# Altium integrated library WR-FPC_rev19a.IntLib: 242 symbols (part 1 of 2) (continued)
## 686106148922 (continued)
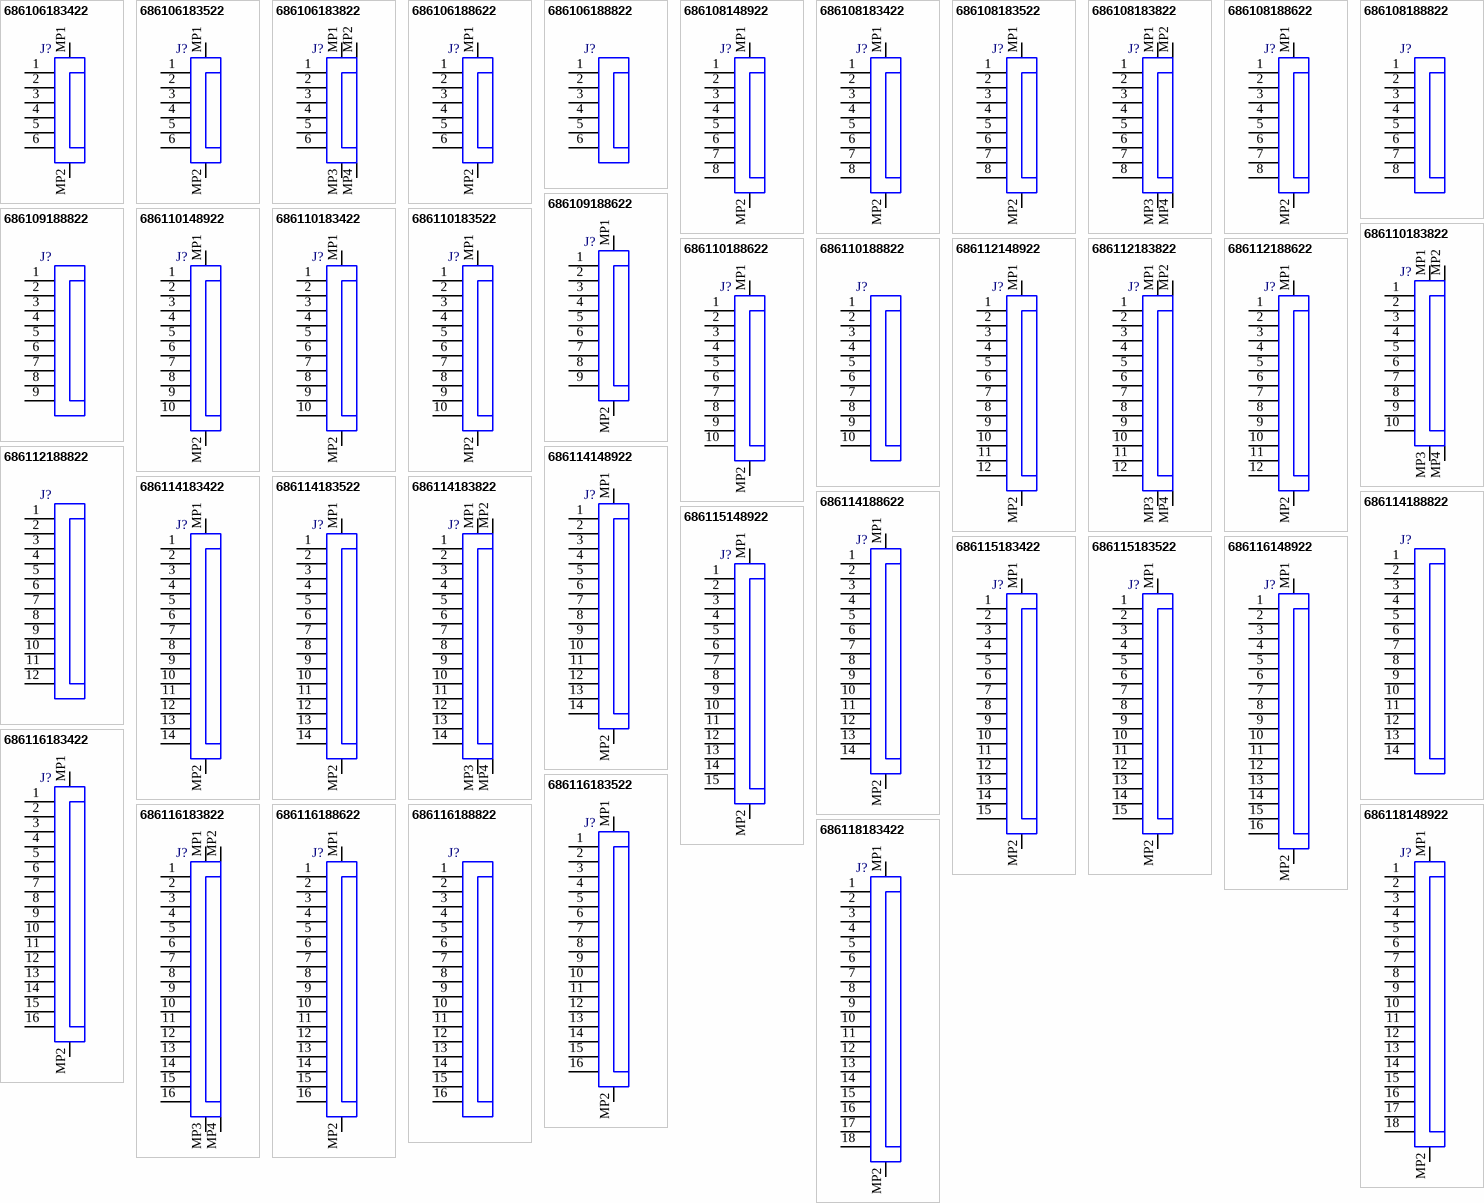
[diagram p1: symbols 686106183422 to 686118183422]

## 686106183422
designator J?
WR-FPC SMT ZIF Horizontal Top Contact Low Profile, pitch 1mm, 6p; Part Number: 686106183422; Contact Resistance: 30mOhm; Pin Number: 6; Working Voltage: 50VAC; Rated Current: 0.8A; ComponentLink1Description: Manufacturer; ComponentLink1URL: http://www.we-online.de; ComponentLink2Description: Datasheet; ComponentLink2URL: https://katalog.we-online.com/em/datasheet/686106183422.pdf; Packaging: Tape and Reel; Pitch: 1mm; Published Date: November 2019; Mounting Technology: SMT; Operating Temperature: -25 to +85degC; Length: 12.2mm; Type: Horizontal; Publisher: Wurth Elektronik
footprint 686106183422
pins: 1, 2, 3, 4, 5, 6, MP1, MP2

## 686106183522
designator J?
WR-FPC SMT ZIF Horizontal Bottom Contact Low Profile, pitch 1mm, 6p; Part Number: 686106183522; Contact Resistance: 30mOhm; Pin Number: 6; Working Voltage: 50VAC; Rated Current: 0.8A; ComponentLink1Description: Manufacturer; ComponentLink1URL: http://www.we-online.de; ComponentLink2Description: Datasheet; ComponentLink2URL: https://katalog.we-online.com/em/datasheet/686106183522.pdf; Packaging: Tape and Reel; Pitch: 1mm; Published Date: November 2019; Mounting Technology: SMT; Operating Temperature: -25 to +85degC; Length: 12.2mm; Type: Horizontal; Publisher: Wurth Elektronik
footprint 686106183522
pins: 1, 2, 3, 4, 5, 6, MP1, MP2

## 686106183822
designator J?
WR-FPC SMT ZIF Vertical Type A, pitch 1mm, 6p; Part Number: 686106183822; Contact Resistance: 30mOhm; Pin Number: 6; Working Voltage: 125VAC; Rated Current: 1A; ComponentLink1Description: Manufacturer; ComponentLink1URL: http://www.we-online.de; ComponentLink2Description: Datasheet; ComponentLink2URL: https://katalog.we-online.com/em/datasheet/686106183822.pdf; Packaging: Tape and Reel; Pitch: 1mm; Published Date: November 2019; Mounting Technology: SMT; Operating Temperature: -25 to +85degC; Length: 12.8mm; Type: Vertical; Publisher: Wurth Elektronik
footprint 686106183822
pins: 1, 2, 3, 4, 5, 6, MP1, MP2, MP3, MP4

## 686106188622
designator J?
WR-FPC SMT LIF Horizontal Top Contact, pitch 1mm, 6p; Part Number: 686106188622; Contact Resistance: 30mOhm; Pin Number: 6; Working Voltage: 125VAC; Rated Current: 1A; ComponentLink1Description: Manufacturer; ComponentLink1URL: http://www.we-online.de; ComponentLink2Description: Datasheet; ComponentLink2URL: https://katalog.we-online.com/em/datasheet/686106188622.pdf; Packaging: Tape and Reel; Pitch: 1mm; Published Date: November 2019; Mounting Technology: SMT; Operating Temperature: -25 to +85degC; Length: 9.8mm; Type: Horizontal; Publisher: Wurth Elektronik
footprint 686106188622
pins: 1, 2, 3, 4, 5, 6, MP1, MP2

## 686106188822
designator J?
WR-FPC SMT LIF Vertical Type A, pitch 1mm, 6p; Part Number: 686106188822; Contact Resistance: 30mOhm; Pin Number: 6; Working Voltage: 125VAC; Rated Current: 1A; ComponentLink1Description: Manufacturer; ComponentLink1URL: http://www.we-online.de; ComponentLink2Description: Datasheet; ComponentLink2URL: https://katalog.we-online.com/em/datasheet/686106188822.pdf; Packaging: Tape and Reel; Pitch: 1mm; Published Date: November 2019; Mounting Technology: SMT; Operating Temperature: -25 to +85degC; Length: 9mm; Type: Vertical; Publisher: Wurth Elektronik
footprint 686106188822
pins: 1, 2, 3, 4, 5, 6

## 686108148922
designator J?
WR-FPC SMT ZIF Horizontal Bottom Contact Hinge Type, pitch 1mm, 8p; Part Number: 686108148922; Contact Resistance: 50mOhm; Pin Number: 8; Working Voltage: 100VAC; Rated Current: 1A; ComponentLink1Description: Manufacturer; ComponentLink1URL: http://www.we-online.de; ComponentLink2Description: Datasheet; ComponentLink2URL: https://katalog.we-online.com/em/datasheet/686108148922.pdf; Packaging: Tape and Reel; Pitch: 1mm; Published Date: November 2019; Mounting Technology: SMT; Operating Temperature: -25 to +85degC; Length: 12.6mm; Type: Horizontal; Publisher: Wurth Elektronik
footprint 686108148922
pins: 1, 2, 3, 4, 5, 6, 7, 8, MP1, MP2

## 686108183422
designator J?
WR-FPC SMT ZIF Horizontal Top Contact Low Profile, pitch 1mm, 8p; Part Number: 686108183422; Contact Resistance: 30mOhm; Pin Number: 8; Working Voltage: 50VAC; Rated Current: 0.8A; ComponentLink1Description: Manufacturer; ComponentLink1URL: http://www.we-online.de; ComponentLink2Description: Datasheet; ComponentLink2URL: https://katalog.we-online.com/em/datasheet/686108183422.pdf; Packaging: Tape and Reel; Pitch: 1mm; Published Date: November 2019; Mounting Technology: SMT; Operating Temperature: -25 to +85degC; Length: 14.2mm; Type: Horizontal; Publisher: Wurth Elektronik
footprint 686108183422
pins: 1, 2, 3, 4, 5, 6, 7, 8, MP1, MP2

## 686108183522
designator J?
WR-FPC SMT ZIF Horizontal Bottom Contact Low Profile, pitch 1mm, 8p; Part Number: 686108183522; Contact Resistance: 30mOhm; Pin Number: 8; Working Voltage: 50VAC; Rated Current: 0.8A; ComponentLink1Description: Manufacturer; ComponentLink1URL: http://www.we-online.de; ComponentLink2Description: Datasheet; ComponentLink2URL: https://katalog.we-online.com/em/datasheet/686108183522.pdf; Packaging: Tape and Reel; Pitch: 1mm; Published Date: November 2019; Mounting Technology: SMT; Operating Temperature: -25 to +85degC; Length: 14.2mm; Type: Horizontal; Publisher: Wurth Elektronik
footprint 686108183522
pins: 1, 2, 3, 4, 5, 6, 7, 8, MP1, MP2

## 686108183822
designator J?
WR-FPC SMT ZIF Vertical Type A, pitch 1mm, 8p; Part Number: 686108183822; Contact Resistance: 30mOhm; Pin Number: 8; Working Voltage: 125VAC; Rated Current: 1A; ComponentLink1Description: Manufacturer; ComponentLink1URL: http://www.we-online.de; ComponentLink2Description: Datasheet; ComponentLink2URL: https://katalog.we-online.com/em/datasheet/686108183822.pdf; Packaging: Tape and Reel; Pitch: 1mm; Published Date: November 2019; Mounting Technology: SMT; Operating Temperature: -25 to +85degC; Length: 14.8mm; Type: Vertical; Publisher: Wurth Elektronik
footprint 686108183822
pins: 1, 2, 3, 4, 5, 6, 7, 8, MP1, MP2, MP3, MP4

## 686108188622
designator J?
WR-FPC SMT LIF Horizontal Top Contact, pitch 1mm, 8p; Part Number: 686108188622; Contact Resistance: 30mOhm; Pin Number: 8; Working Voltage: 125VAC; Rated Current: 1A; ComponentLink1Description: Manufacturer; ComponentLink1URL: http://www.we-online.de; ComponentLink2Description: Datasheet; ComponentLink2URL: https://katalog.we-online.com/em/datasheet/686108188622.pdf; Packaging: Tape and Reel; Pitch: 1mm; Published Date: November 2019; Mounting Technology: SMT; Operating Temperature: -25 to +85degC; Length: 11.8mm; Type: Horizontal; Publisher: Wurth Elektronik
footprint 686108188622
pins: 1, 2, 3, 4, 5, 6, 7, 8, MP1, MP2

## 686108188822
designator J?
WR-FPC SMT LIF Vertical Type A, pitch 1mm, 8p; Part Number: 686108188822; Contact Resistance: 30mOhm; Pin Number: 8; Working Voltage: 125VAC; Rated Current: 1A; ComponentLink1Description: Manufacturer; ComponentLink1URL: http://www.we-online.de; ComponentLink2Description: Datasheet; ComponentLink2URL: https://katalog.we-online.com/em/datasheet/686108188822.pdf; Packaging: Tape and Reel; Pitch: 1mm; Published Date: November 2019; Mounting Technology: SMT; Operating Temperature: -25 to +85degC; Length: 11mm; Type: Vertical; Publisher: Wurth Elektronik
footprint 686108188822
pins: 1, 2, 3, 4, 5, 6, 7, 8

## 686109188622
designator J?
WR-FPC SMT LIF Horizontal Top Contact, pitch 1mm, 9p; Part Number: 686109188622; Contact Resistance: 30mOhm; Pin Number: 9; Working Voltage: 125VAC; Rated Current: 1A; ComponentLink1Description: Manufacturer; ComponentLink1URL: http://www.we-online.de; ComponentLink2Description: Datasheet; ComponentLink2URL: https://katalog.we-online.com/em/datasheet/686109188622.pdf; Packaging: Tape and Reel; Pitch: 1mm; Published Date: November 2019; Mounting Technology: SMT; Operating Temperature: -25 to +85degC; Length: 12.8mm; Type: Horizontal; Publisher: Wurth Elektronik
footprint 686109188622
pins: 1, 2, 3, 4, 5, 6, 7, 8, 9, MP1, MP2

## 686109188822
designator J?
WR-FPC SMT LIF Vertical Type A, pitch 1mm, 9p; Part Number: 686109188822; Contact Resistance: 30mOhm; Pin Number: 9; Working Voltage: 125VAC; Rated Current: 1A; ComponentLink1Description: Manufacturer; ComponentLink1URL: http://www.we-online.de; ComponentLink2Description: Datasheet; ComponentLink2URL: https://katalog.we-online.com/em/datasheet/686109188822.pdf; Packaging: Tape and Reel; Pitch: 1mm; Published Date: November 2019; Mounting Technology: SMT; Operating Temperature: -25 to +85degC; Length: 12mm; Type: Vertical; Publisher: Wurth Elektronik
footprint 686109188822
pins: 1, 2, 3, 4, 5, 6, 7, 8, 9

## 686110148922
designator J?
WR-FPC SMT ZIF Horizontal Bottom Contact Hinge Type, pitch 1mm, 10p; Part Number: 686110148922; Contact Resistance: 50mOhm; Pin Number: 10; Working Voltage: 100VAC; Rated Current: 1A; ComponentLink1Description: Manufacturer; ComponentLink1URL: http://www.we-online.de; ComponentLink2Description: Datasheet; ComponentLink2URL: https://katalog.we-online.com/em/datasheet/686110148922.pdf; Packaging: Tape and Reel; Pitch: 1mm; Published Date: November 2019; Mounting Technology: SMT; Operating Temperature: -25 to +85degC; Length: 14.6mm; Type: Horizontal; Publisher: Wurth Elektronik
footprint 686110148922
pins: 1, 2, 3, 4, 5, 6, 7, 8, 9, 10, MP1, MP2

## 686110183422
designator J?
WR-FPC SMT ZIF Horizontal Top Contact Low Profile, pitch 1mm, 10p; Part Number: 686110183422; Contact Resistance: 30mOhm; Pin Number: 10; Working Voltage: 50VAC; Rated Current: 0.8A; ComponentLink1Description: Manufacturer; ComponentLink1URL: http://www.we-online.de; ComponentLink2Description: Datasheet; ComponentLink2URL: https://katalog.we-online.com/em/datasheet/686110183422.pdf; Packaging: Tape and Reel; Pitch: 1mm; Published Date: November 2019; Mounting Technology: SMT; Operating Temperature: -25 to +85degC; Length: 16.2mm; Type: Horizontal; Publisher: Wurth Elektronik
footprint 686110183422
pins: 1, 2, 3, 4, 5, 6, 7, 8, 9, 10, MP1, MP2

## 686110183522
designator J?
WR-FPC SMT ZIF Horizontal Bottom Contact Low Profile, pitch 1mm, 10p; Part Number: 686110183522; Contact Resistance: 30mOhm; Pin Number: 10; Working Voltage: 50VAC; Rated Current: 0.8A; ComponentLink1Description: Manufacturer; ComponentLink1URL: http://www.we-online.de; ComponentLink2Description: Datasheet; ComponentLink2URL: https://katalog.we-online.com/em/datasheet/686110183522.pdf; Packaging: Tape and Reel; Pitch: 1mm; Published Date: November 2019; Mounting Technology: SMT; Operating Temperature: -25 to +85degC; Length: 16.2mm; Type: Horizontal; Publisher: Wurth Elektronik
footprint 686110183522
pins: 1, 2, 3, 4, 5, 6, 7, 8, 9, 10, MP1, MP2

## 686110183822
designator J?
WR-FPC SMT ZIF Vertical Type A, pitch 1mm, 10p; Part Number: 686110183822; Contact Resistance: 30mOhm; Pin Number: 10; Working Voltage: 125VAC; Rated Current: 1A; ComponentLink1Description: Manufacturer; ComponentLink1URL: http://www.we-online.de; ComponentLink2Description: Datasheet; ComponentLink2URL: https://katalog.we-online.com/em/datasheet/686110183822.pdf; Packaging: Tape and Reel; Pitch: 1mm; Published Date: November 2019; Mounting Technology: SMT; Operating Temperature: -25 to +85degC; Length: 16.8mm; Type: Vertical; Publisher: Wurth Elektronik
footprint 686110183822
pins: 1, 2, 3, 4, 5, 6, 7, 8, 9, 10, MP1, MP2, MP3, MP4

## 686110188622
designator J?
WR-FPC SMT LIF Horizontal Top Contact, pitch 1mm, 10p; Part Number: 686110188622; Contact Resistance: 30mOhm; Pin Number: 10; Working Voltage: 125VAC; Rated Current: 1A; ComponentLink1Description: Manufacturer; ComponentLink1URL: http://www.we-online.de; ComponentLink2Description: Datasheet; ComponentLink2URL: https://katalog.we-online.com/em/datasheet/686110188622.pdf; Packaging: Tape and Reel; Pitch: 1mm; Published Date: November 2019; Mounting Technology: SMT; Operating Temperature: -25 to +85degC; Length: 13.8mm; Type: Horizontal; Publisher: Wurth Elektronik
footprint 686110188622
pins: 1, 2, 3, 4, 5, 6, 7, 8, 9, 10, MP1, MP2

## 686110188822
designator J?
WR-FPC SMT LIF Vertical Type A, pitch 1mm, 10p; Part Number: 686110188822; Contact Resistance: 30mOhm; Pin Number: 10; Working Voltage: 125VAC; Rated Current: 1A; ComponentLink1Description: Manufacturer; ComponentLink1URL: http://www.we-online.de; ComponentLink2Description: Datasheet; ComponentLink2URL: https://katalog.we-online.com/em/datasheet/686110188822.pdf; Packaging: Tape and Reel; Pitch: 1mm; Published Date: November 2019; Mounting Technology: SMT; Operating Temperature: -25 to +85degC; Length: 13mm; Type: Vertical; Publisher: Wurth Elektronik
footprint 686110188822
pins: 1, 2, 3, 4, 5, 6, 7, 8, 9, 10

## 686112148922
designator J?
WR-FPC SMT ZIF Horizontal Bottom Contact Hinge Type, pitch 1mm, 12p; Part Number: 686112148922; Contact Resistance: 50mOhm; Pin Number: 12; Working Voltage: 100VAC; Rated Current: 1A; ComponentLink1Description: Manufacturer; ComponentLink1URL: http://www.we-online.de; ComponentLink2Description: Datasheet; ComponentLink2URL: https://katalog.we-online.com/em/datasheet/686112148922.pdf; Packaging: Tape and Reel; Pitch: 1mm; Published Date: November 2019; Mounting Technology: SMT; Operating Temperature: -25 to +85degC; Length: 16.6mm; Type: Horizontal; Publisher: Wurth Elektronik
footprint 686112148922
pins: 1, 2, 3, 4, 5, 6, 7, 8, 9, 10, 11, 12, MP1, MP2

## 686112183822
designator J?
WR-FPC SMT ZIF Vertical Type A, pitch 1mm, 12p; Part Number: 686112183822; Contact Resistance: 30mOhm; Pin Number: 12; Working Voltage: 125VAC; Rated Current: 1A; ComponentLink1Description: Manufacturer; ComponentLink1URL: http://www.we-online.de; ComponentLink2Description: Datasheet; ComponentLink2URL: https://katalog.we-online.com/em/datasheet/686112183822.pdf; Packaging: Tape and Reel; Pitch: 1mm; Published Date: November 2019; Mounting Technology: SMT; Operating Temperature: -25 to +85degC; Length: 18.8mm; Type: Vertical; Publisher: Wurth Elektronik
footprint 686112183822
pins: 1, 2, 3, 4, 5, 6, 7, 8, 9, 10, 11, 12, MP1, MP2, MP3, MP4

## 686112188622
designator J?
WR-FPC SMT LIF Horizontal Top Contact, pitch 1mm, 12p; Part Number: 686112188622; Contact Resistance: 30mOhm; Pin Number: 12; Working Voltage: 125VAC; Rated Current: 1A; ComponentLink1Description: Manufacturer; ComponentLink1URL: http://www.we-online.de; ComponentLink2Description: Datasheet; ComponentLink2URL: https://katalog.we-online.com/em/datasheet/686112188622.pdf; Packaging: Tape and Reel; Pitch: 1mm; Published Date: November 2019; Mounting Technology: SMT; Operating Temperature: -25 to +85degC; Length: 15.8mm; Type: Horizontal; Publisher: Wurth Elektronik
footprint 686112188622
pins: 1, 2, 3, 4, 5, 6, 7, 8, 9, 10, 11, 12, MP1, MP2

## 686112188822
designator J?
WR-FPC SMT LIF Vertical Type A, pitch 1mm, 12p; Part Number: 686112188822; Contact Resistance: 30mOhm; Pin Number: 12; Working Voltage: 125VAC; Rated Current: 1A; ComponentLink1Description: Manufacturer; ComponentLink1URL: http://www.we-online.de; ComponentLink2Description: Datasheet; ComponentLink2URL: https://katalog.we-online.com/em/datasheet/686112188822.pdf; Packaging: Tape and Reel; Pitch: 1mm; Published Date: November 2019; Mounting Technology: SMT; Operating Temperature: -25 to +85degC; Length: 15mm; Type: Vertical; Publisher: Wurth Elektronik
footprint 686112188822
pins: 1, 2, 3, 4, 5, 6, 7, 8, 9, 10, 11, 12

## 686114148922
designator J?
WR-FPC SMT ZIF Horizontal Bottom Contact Hinge Type, pitch 1mm, 14p; Part Number: 686114148922; Contact Resistance: 50mOhm; Pin Number: 14; Working Voltage: 100VAC; Rated Current: 1A; ComponentLink1Description: Manufacturer; ComponentLink1URL: http://www.we-online.de; ComponentLink2Description: Datasheet; ComponentLink2URL: https://katalog.we-online.com/em/datasheet/686114148922.pdf; Packaging: Tape and Reel; Pitch: 1mm; Published Date: November 2019; Mounting Technology: SMT; Operating Temperature: -25 to +85degC; Length: 18.6mm; Type: Horizontal; Publisher: Wurth Elektronik
footprint 686114148922
pins: 1, 2, 3, 4, 5, 6, 7, 8, 9, 10, 11, 12, 13, 14, MP1, MP2

## 686114183422
designator J?
WR-FPC SMT ZIF Horizontal Top Contact Low Profile, pitch 1mm, 14p; Part Number: 686114183422; Contact Resistance: 30mOhm; Pin Number: 14; Working Voltage: 50VAC; Rated Current: 0.8A; ComponentLink1Description: Manufacturer; ComponentLink1URL: http://www.we-online.de; ComponentLink2Description: Datasheet; ComponentLink2URL: https://katalog.we-online.com/em/datasheet/686114183422.pdf; Packaging: Tape and Reel; Pitch: 1mm; Published Date: November 2019; Mounting Technology: SMT; Operating Temperature: -25 to +85degC; Length: 20.2mm; Type: Horizontal; Publisher: Wurth Elektronik
footprint 686114183422
pins: 1, 2, 3, 4, 5, 6, 7, 8, 9, 10, 11, 12, 13, 14, MP1, MP2

## 686114183522
designator J?
WR-FPC SMT ZIF Horizontal Bottom Contact Low Profile, pitch 1mm, 14p; Part Number: 686114183522; Contact Resistance: 30mOhm; Pin Number: 14; Working Voltage: 50VAC; Rated Current: 0.8A; ComponentLink1Description: Manufacturer; ComponentLink1URL: http://www.we-online.de; ComponentLink2Description: Datasheet; ComponentLink2URL: https://katalog.we-online.com/em/datasheet/686114183522.pdf; Packaging: Tape and Reel; Pitch: 1mm; Published Date: November 2019; Mounting Technology: SMT; Operating Temperature: -25 to +85degC; Length: 20.2mm; Type: Horizontal; Publisher: Wurth Elektronik
footprint 686114183522
pins: 1, 2, 3, 4, 5, 6, 7, 8, 9, 10, 11, 12, 13, 14, MP1, MP2

## 686114183822
designator J?
WR-FPC SMT ZIF Vertical Type A, pitch 1mm, 14p; Part Number: 686114183822; Contact Resistance: 30mOhm; Pin Number: 14; Working Voltage: 125VAC; Rated Current: 1A; ComponentLink1Description: Manufacturer; ComponentLink1URL: http://www.we-online.de; ComponentLink2Description: Datasheet; ComponentLink2URL: https://katalog.we-online.com/em/datasheet/686114183822.pdf; Packaging: Tape and Reel; Pitch: 1mm; Published Date: November 2019; Mounting Technology: SMT; Operating Temperature: -25 to +85degC; Length: 20.8mm; Type: Vertical; Publisher: Wurth Elektronik
footprint 686114183822
pins: 1, 2, 3, 4, 5, 6, 7, 8, 9, 10, 11, 12, 13, 14, MP1, MP2, MP3, MP4

## 686114188622
designator J?
WR-FPC SMT LIF Horizontal Top Contact, pitch 1mm, 14p; Part Number: 686114188622; Contact Resistance: 30mOhm; Pin Number: 14; Working Voltage: 125VAC; Rated Current: 1A; ComponentLink1Description: Manufacturer; ComponentLink1URL: http://www.we-online.de; ComponentLink2Description: Datasheet; ComponentLink2URL: https://katalog.we-online.com/em/datasheet/686114188622.pdf; Packaging: Tape and Reel; Pitch: 1mm; Published Date: November 2019; Mounting Technology: SMT; Operating Temperature: -25 to +85degC; Length: 17.8mm; Type: Horizontal; Publisher: Wurth Elektronik
footprint 686114188622
pins: 1, 2, 3, 4, 5, 6, 7, 8, 9, 10, 11, 12, 13, 14, MP1, MP2

## 686114188822
designator J?
WR-FPC SMT LIF Vertical Type A, pitch 1mm, 14p; Part Number: 686114188822; Contact Resistance: 30mOhm; Pin Number: 14; Working Voltage: 125VAC; Rated Current: 1A; ComponentLink1Description: Manufacturer; ComponentLink1URL: http://www.we-online.de; ComponentLink2Description: Datasheet; ComponentLink2URL: https://katalog.we-online.com/em/datasheet/686114188822.pdf; Packaging: Tape and Reel; Pitch: 1mm; Published Date: November 2019; Mounting Technology: SMT; Operating Temperature: -25 to +85degC; Length: 17mm; Type: Vertical; Publisher: Wurth Elektronik
footprint 686114188822
pins: 1, 2, 3, 4, 5, 6, 7, 8, 9, 10, 11, 12, 13, 14

## 686115148922
designator J?
WR-FPC SMT ZIF Horizontal Bottom Contact Hinge Type, pitch 1mm, 15p; Part Number: 686115148922; Contact Resistance: 50mOhm; Pin Number: 15; Working Voltage: 100VAC; Rated Current: 1A; ComponentLink1Description: Manufacturer; ComponentLink1URL: http://www.we-online.de; ComponentLink2Description: Datasheet; ComponentLink2URL: https://katalog.we-online.com/em/datasheet/686115148922.pdf; Packaging: Tape and Reel; Pitch: 1mm; Published Date: November 2019; Mounting Technology: SMT; Operating Temperature: -25 to +85degC; Length: 19.6mm; Type: Horizontal; Publisher: Wurth Elektronik
footprint 686115148922
pins: 1, 2, 3, 4, 5, 6, 7, 8, 9, 10, 11, 12, 13, 14, 15, MP1, MP2

## 686115183422
designator J?
WR-FPC SMT ZIF Horizontal Top Contact Low Profile, pitch 1mm, 15p; Part Number: 686115183422; Contact Resistance: 30mOhm; Pin Number: 15; Working Voltage: 50VAC; Rated Current: 0.8A; ComponentLink1Description: Manufacturer; ComponentLink1URL: http://www.we-online.de; ComponentLink2Description: Datasheet; ComponentLink2URL: https://katalog.we-online.com/em/datasheet/686115183422.pdf; Packaging: Tape and Reel; Pitch: 1mm; Published Date: November 2019; Mounting Technology: SMT; Operating Temperature: -25 to +85degC; Length: 21.2mm; Type: Horizontal; Publisher: Wurth Elektronik
footprint 686115183422
pins: 1, 2, 3, 4, 5, 6, 7, 8, 9, 10, 11, 12, 13, 14, 15, MP1, MP2

## 686115183522
designator J?
WR-FPC SMT ZIF Horizontal Bottom Contact Low Profile, pitch 1mm, 15p; Part Number: 686115183522; Contact Resistance: 30mOhm; Pin Number: 15; Working Voltage: 50VAC; Rated Current: 0.8A; ComponentLink1Description: Manufacturer; ComponentLink1URL: http://www.we-online.de; ComponentLink2Description: Datasheet; ComponentLink2URL: https://katalog.we-online.com/em/datasheet/686115183522.pdf; Packaging: Tape and Reel; Pitch: 1mm; Published Date: November 2019; Mounting Technology: SMT; Operating Temperature: -25 to +85degC; Length: 21.2mm; Type: Horizontal; Publisher: Wurth Elektronik
footprint 686115183522
pins: 1, 2, 3, 4, 5, 6, 7, 8, 9, 10, 11, 12, 13, 14, 15, MP1, MP2

## 686116148922
designator J?
WR-FPC SMT ZIF Horizontal Bottom Contact Hinge Type, pitch 1mm, 16p; Part Number: 686116148922; Contact Resistance: 50mOhm; Pin Number: 16; Working Voltage: 100VAC; Rated Current: 1A; ComponentLink1Description: Manufacturer; ComponentLink1URL: http://www.we-online.de; ComponentLink2Description: Datasheet; ComponentLink2URL: https://katalog.we-online.com/em/datasheet/686116148922.pdf; Packaging: Tape and Reel; Pitch: 1mm; Published Date: November 2019; Mounting Technology: SMT; Operating Temperature: -25 to +85degC; Length: 20.6mm; Type: Horizontal; Publisher: Wurth Elektronik
footprint 686116148922
pins: 1, 2, 3, 4, 5, 6, 7, 8, 9, 10, 11, 12, 13, 14, 15, 16, MP1, MP2

## 686116183422
designator J?
WR-FPC SMT ZIF Horizontal Top Contact Low Profile, pitch 1mm, 16p; Part Number: 686116183422; Contact Resistance: 30mOhm; Pin Number: 16; Working Voltage: 50VAC; Rated Current: 0.8A; ComponentLink1Description: Manufacturer; ComponentLink1URL: http://www.we-online.de; ComponentLink2Description: Datasheet; ComponentLink2URL: https://katalog.we-online.com/em/datasheet/686116183422.pdf; Packaging: Tape and Reel; Pitch: 1mm; Published Date: November 2019; Mounting Technology: SMT; Operating Temperature: -25 to +85degC; Length: 22.2mm; Type: Horizontal; Publisher: Wurth Elektronik
footprint 686116183422
pins: 1, 2, 3, 4, 5, 6, 7, 8, 9, 10, 11, 12, 13, 14, 15, 16, MP1, MP2

## 686116183522
designator J?
WR-FPC SMT ZIF Horizontal Bottom Contact Low Profile, pitch 1mm, 16p; Part Number: 686116183522; Contact Resistance: 30mOhm; Pin Number: 16; Working Voltage: 50VAC; Rated Current: 0.8A; ComponentLink1Description: Manufacturer; ComponentLink1URL: http://www.we-online.de; ComponentLink2Description: Datasheet; ComponentLink2URL: https://katalog.we-online.com/em/datasheet/686116183522.pdf; Packaging: Tape and Reel; Pitch: 1mm; Published Date: November 2019; Mounting Technology: SMT; Operating Temperature: -25 to +85degC; Length: 22.2mm; Type: Horizontal; Publisher: Wurth Elektronik
footprint 686116183522
pins: 1, 2, 3, 4, 5, 6, 7, 8, 9, 10, 11, 12, 13, 14, 15, 16, MP1, MP2

## 686116183822
designator J?
WR-FPC SMT ZIF Vertical Type A, pitch 1mm, 16p; Part Number: 686116183822; Contact Resistance: 30mOhm; Pin Number: 16; Working Voltage: 125VAC; Rated Current: 1A; ComponentLink1Description: Manufacturer; ComponentLink1URL: http://www.we-online.de; ComponentLink2Description: Datasheet; ComponentLink2URL: https://katalog.we-online.com/em/datasheet/686116183822.pdf; Packaging: Tape and Reel; Pitch: 1mm; Published Date: November 2019; Mounting Technology: SMT; Operating Temperature: -25 to +85degC; Length: 22.8mm; Type: Vertical; Publisher: Wurth Elektronik
footprint 686116183822
pins: 1, 2, 3, 4, 5, 6, 7, 8, 9, 10, 11, 12, 13, 14, 15, 16, MP1, MP2, MP3, MP4

## 686116188622
designator J?
WR-FPC SMT LIF Horizontal Top Contact, pitch 1mm, 16p; Part Number: 686116188622; Contact Resistance: 30mOhm; Pin Number: 16; Working Voltage: 125VAC; Rated Current: 1A; ComponentLink1Description: Manufacturer; ComponentLink1URL: http://www.we-online.de; ComponentLink2Description: Datasheet; ComponentLink2URL: https://katalog.we-online.com/em/datasheet/686116188622.pdf; Packaging: Tape and Reel; Pitch: 1mm; Published Date: November 2019; Mounting Technology: SMT; Operating Temperature: -25 to +85degC; Length: 19.8mm; Type: Horizontal; Publisher: Wurth Elektronik
footprint 686116188622
pins: 1, 2, 3, 4, 5, 6, 7, 8, 9, 10, 11, 12, 13, 14, 15, 16, MP1, MP2

## 686116188822
designator J?
WR-FPC SMT LIF Vertical Type A, pitch 1mm, 16p; Part Number: 686116188822; Contact Resistance: 30mOhm; Pin Number: 16; Working Voltage: 125VAC; Rated Current: 1A; ComponentLink1Description: Manufacturer; ComponentLink1URL: http://www.we-online.de; ComponentLink2Description: Datasheet; ComponentLink2URL: https://katalog.we-online.com/em/datasheet/686116188822.pdf; Packaging: Tape and Reel; Pitch: 1mm; Published Date: November 2019; Mounting Technology: SMT; Operating Temperature: -25 to +85degC; Length: 19mm; Type: Vertical; Publisher: Wurth Elektronik
footprint 686116188822
pins: 1, 2, 3, 4, 5, 6, 7, 8, 9, 10, 11, 12, 13, 14, 15, 16

## 686118148922
designator J?
WR-FPC SMT ZIF Horizontal Bottom Contact Hinge Type, pitch 1mm, 18p; Part Number: 686118148922; Contact Resistance: 50mOhm; Pin Number: 18; Working Voltage: 100VAC; Rated Current: 1A; ComponentLink1Description: Manufacturer; ComponentLink1URL: http://www.we-online.de; ComponentLink2Description: Datasheet; ComponentLink2URL: https://katalog.we-online.com/em/datasheet/686118148922.pdf; Packaging: Tape and Reel; Pitch: 1mm; Published Date: November 2019; Mounting Technology: SMT; Operating Temperature: -25 to +85degC; Length: 22.6mm; Type: Horizontal; Publisher: Wurth Elektronik
footprint 686118148922
pins: 1, 2, 3, 4, 5, 6, 7, 8, 9, 10, 11, 12, 13, 14, 15, 16, 17, 18, MP1, MP2

## 686118183422
designator J?
WR-FPC SMT ZIF Horizontal Top Contact Low Profile, pitch 1mm, 18p; Part Number: 686118183422; Contact Resistance: 30mOhm; Pin Number: 18; Working Voltage: 50VAC; Rated Current: 0.8A; ComponentLink1Description: Manufacturer; ComponentLink1URL: http://www.we-online.de; ComponentLink2Description: Datasheet; ComponentLink2URL: https://katalog.we-online.com/em/datasheet/686118183422.pdf; Packaging: Tape and Reel; Pitch: 1mm; Published Date: November 2019; Mounting Technology: SMT; Operating Temperature: -25 to +85degC; Length: 24.2mm; Type: Horizontal; Publisher: Wurth Elektronik
footprint 686118183422
pins: 1, 2, 3, 4, 5, 6, 7, 8, 9, 10, 11, 12, 13, 14, 15, 16, 17, 18, MP1, MP2

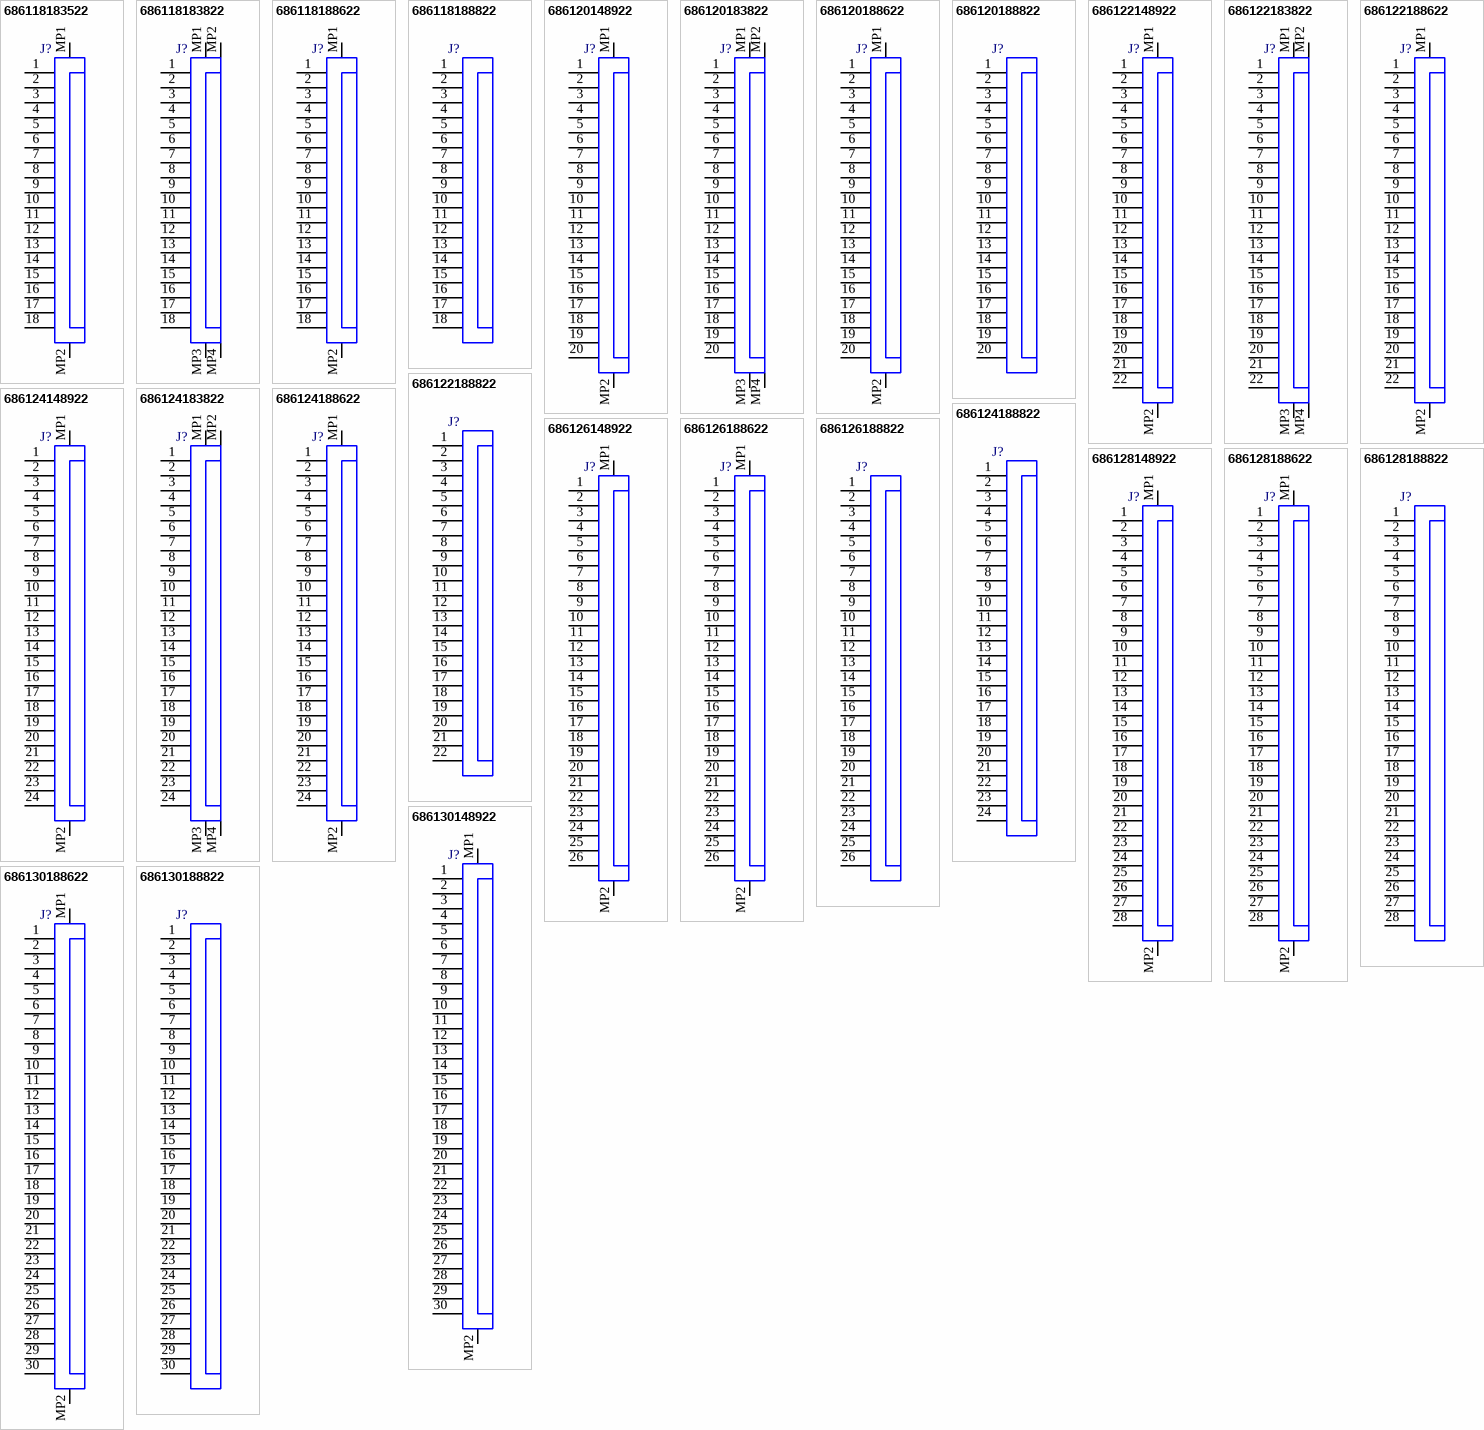
[diagram p2: symbols 686118183522 to 686130188822]

## 686118183522
designator J?
WR-FPC SMT ZIF Horizontal Bottom Contact Low Profile, pitch 1mm, 18p; Part Number: 686118183522; Contact Resistance: 30mOhm; Pin Number: 18; Working Voltage: 50VAC; Rated Current: 0.8A; ComponentLink1Description: Manufacturer; ComponentLink1URL: http://www.we-online.de; ComponentLink2Description: Datasheet; ComponentLink2URL: https://katalog.we-online.com/em/datasheet/686118183522.pdf; Packaging: Tape and Reel; Pitch: 1mm; Published Date: November 2019; Mounting Technology: SMT; Operating Temperature: -25 to +85degC; Length: 24.2mm; Type: Horizontal; Publisher: Wurth Elektronik
footprint 686118183522
pins: 1, 2, 3, 4, 5, 6, 7, 8, 9, 10, 11, 12, 13, 14, 15, 16, 17, 18, MP1, MP2

## 686118183822
designator J?
WR-FPC SMT ZIF Vertical Type A, pitch 1mm, 18p; Part Number: 686118183822; Contact Resistance: 30mOhm; Pin Number: 18; Working Voltage: 125VAC; Rated Current: 1A; ComponentLink1Description: Manufacturer; ComponentLink1URL: http://www.we-online.de; ComponentLink2Description: Datasheet; ComponentLink2URL: https://katalog.we-online.com/em/datasheet/686118183822.pdf; Packaging: Tape and Reel; Pitch: 1mm; Published Date: November 2019; Mounting Technology: SMT; Operating Temperature: -25 to +85degC; Length: 24.8mm; Type: Vertical; Publisher: Wurth Elektronik
footprint 686118183822
pins: 1, 2, 3, 4, 5, 6, 7, 8, 9, 10, 11, 12, 13, 14, 15, 16, 17, 18, MP1, MP2, MP3, MP4
